# Altium footprint library GyokuRe.PcbLib: 1248 footprints (part 53 of 78)
Each footprint in its own frame and in the unit in brackets; x right, y up, seen from the top. Pads: shape width x height; smd on the part's side, far side on the other; paste and mask are expansions set on the pad; w line width, h text height; cw(c..) or ccw(c..) is an arc to the next point about the centre after c.
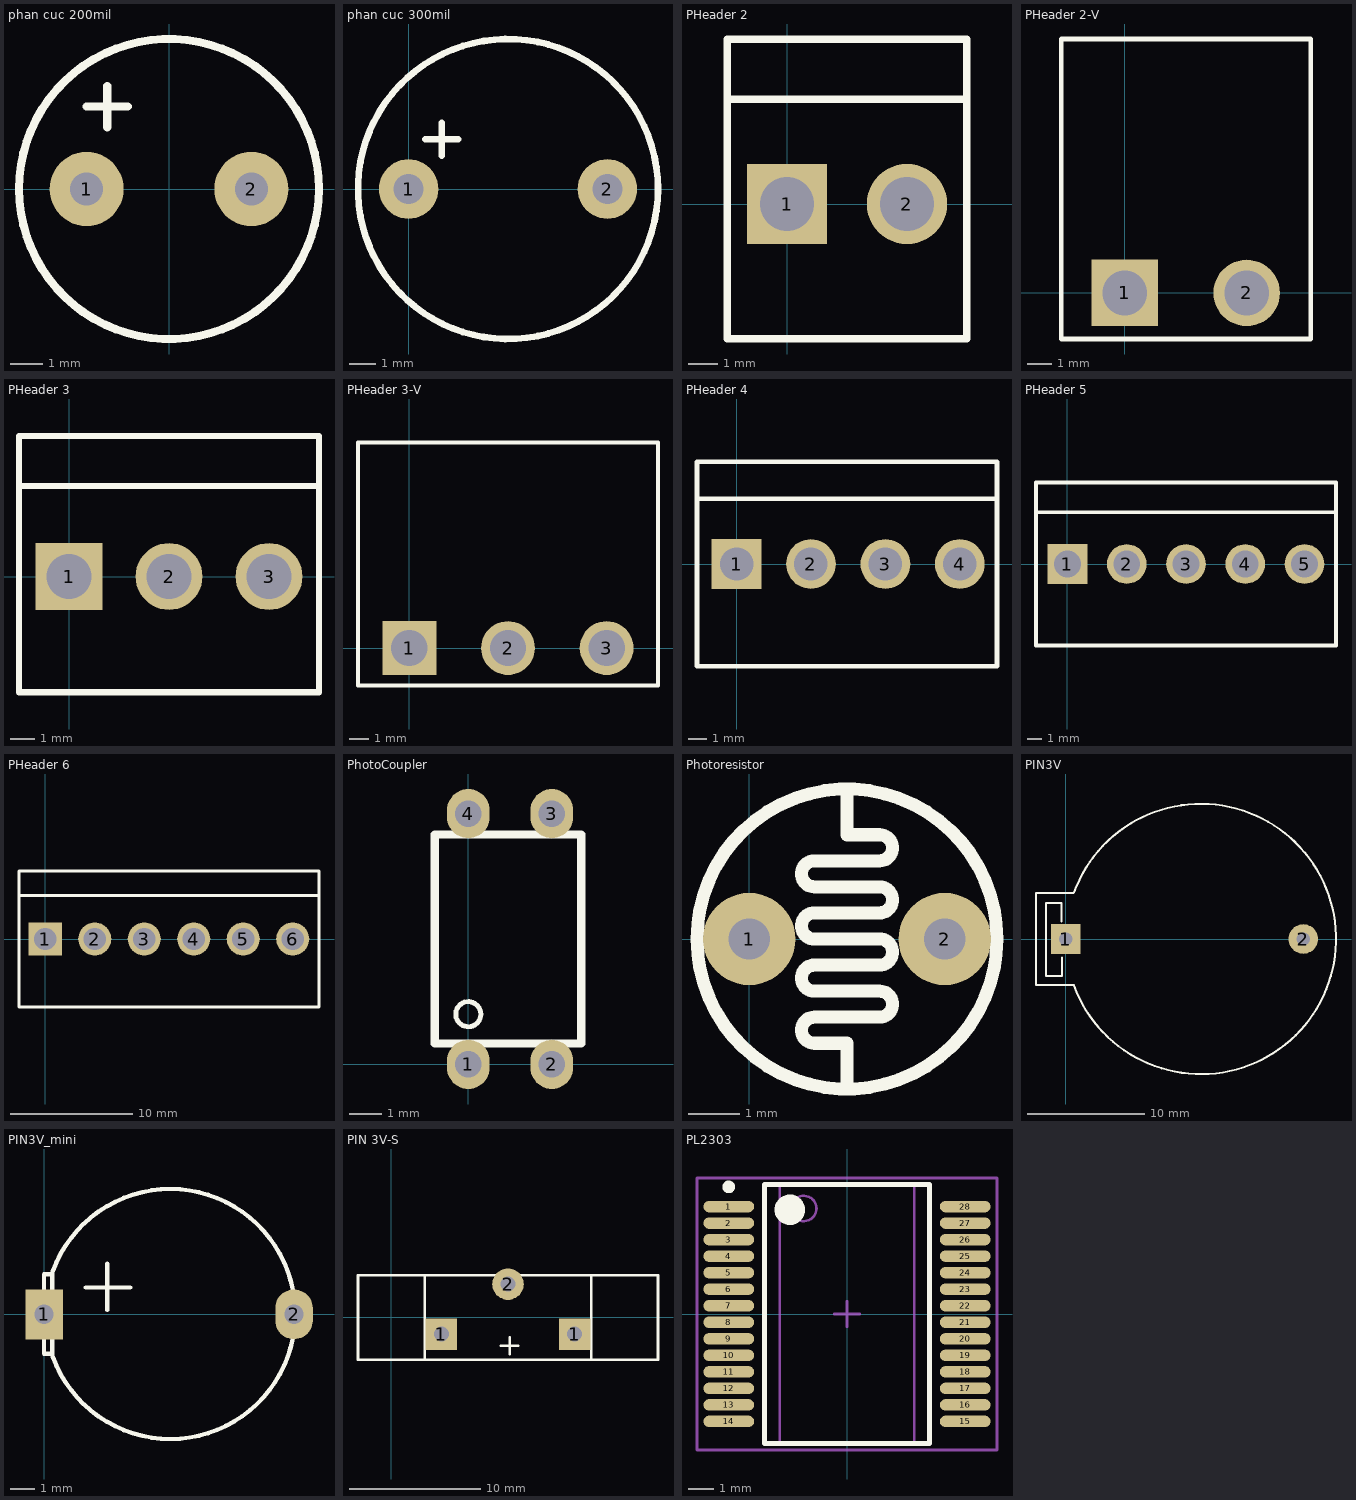
[diagram p52: the footprints below, top view; thin cyan lines are the x and y axes]

## PCBComponent_1 - duplicate [mm]

## phan cuc 200mil [mil]
pads (2):
  round 90 hole 40: 1(-100,0) 2(100,0)
Top Overlay:
  circle w10: c0,0 r182
  lines w10: -100,100 -50,100 ; -75,75 -75,125

## phan cuc 300mil [mil]
pads (2):
  round 90 hole 45: 1(0,0) 2(300,0)
Top Overlay:
  circle w10: c150,0 r226.38
  lines w10: 25,75 75,75 ; 50,50 50,100

## PHeader 2 [mil] "Connector; Header; Power; 2 Position; Solder Pad 35mil"
pads (2):
  rect 107x107 hole 72: 1(0,0)
  round 107 hole 72: 2(160,0)
Top Overlay:
  lines w10: -75,140 240,140 ; -80,-180 -80,220 240,220 240,-180 -80,-180

## PHeader 2-V [mil] "Connector; Header; Power; 2 Position; Vertical; Solder Pad 35mil"
pads (2):
  rect 107x107 hole 72: 1(0,0)
  round 107 hole 72: 2(196,0)
Top Overlay:
  lines w7.87: -102,-74 299,-74 299,408 -102,408 -102,-74
3D body "User Library-BigHeader 5EHDR_1P.step": height 124.02, standoff -366.97, extent 97.58,-68.89 294.43,403.55
3D body "User Library-BigHeader 5EHDR_1P.step": height 124.02, standoff -366.97, extent -98.42,-68.89 98.43,403.55

## PHeader 3 [mil] "Connector; Power; Header; 3 Position; Solder Pad 35mil"
pads (3):
  rect 107x107 hole 72: 1(0,0)
  round 107 hole 72: 2(160,0) 3(320,0)
Top Overlay:
  lines w10: -80,145 400,145 ; -80,-185 -80,225 400,225 400,-185 -80,-185

## PHeader 3-V [mil] "Connector; Header; Power; 3 Position; Vertical; Solder Pad 35mil"
pads (3):
  rect 107x107 hole 72: 1(0,0)
  round 107 hole 72: 2(196,0) 3(392,0)
Top Overlay:
  lines w7.87: -102,-74 494,-74 494,408 -102,408 -102,-74
3D body "User Library-BigHeader 5EHDR_1P.step": height 124.02, standoff -366.97, extent 97.58,-68.89 294.43,403.55
3D body "User Library-BigHeader 5EHDR_1P.step": height 124.02, standoff -366.97, extent -98.42,-68.89 98.43,403.55
3D body "User Library-BigHeader 5EHDR_1P.step": height 124.02, standoff -366.97, extent 293.58,-68.89 490.43,403.55

## PHeader 4 [mil] "Connector; Header; Power; 4 Position; Solder Pad 35mil"
pads (4):
  rect 107x107 hole 72: 1(0,0)
  round 107 hole 72: 2(160,0) 3(320,0) 4(480,0)
Top Overlay:
  lines w10: -85,140 555,140 ; -85,-220 560,-220 560,220 -85,220 -85,-220

## PHeader 5 [mil] "Connector; Header; Power; 5 Position; Solder Pad 35mil"
pads (5):
  rect 107x107 hole 72: 1(0,0)
  round 107 hole 72: 2(160,0) 3(320,0) 4(480,0) 5(640,0)
Top Overlay:
  lines w10: -85,140 725,140 ; -85,-220 725,-220 725,220 -85,220 -85,-220

## PHeader 6 [mil] "Connector; Header; Power; 6 Position; Solder Pad 35mil"
pads (6):
  rect 107x107 hole 72: 1(0,0)
  round 107 hole 72: 2(160,0) 3(320,0) 4(480,0) 5(640,0) 6(800,0)
Top Overlay:
  lines w10: -85,140 885,140 ; -85,-220 885,-220 885,220 -85,220 -85,-220

## PhotoCoupler [mm] "Opto quang"
pads (4):
  oval 1.3x1.5 hole 0.8: 1(0,0) 2(2.54,0) 3(2.54,7.62) 4(0,7.62)
Top Overlay:
  circle w0.15: c0,1.524 r0.381
  lines w0.254: -1.016,0.635 3.429,0.635 3.429,6.985 -1.016,6.985 -1.016,0.635
3D body "SW3DPS-DIP4-DEFAULT.step": height 4.31, standoff -3.28, extent -1.532,-0.19 4.008,7.81

## Photoresistor [mm]
pads (2):
  round 1.8 hole 0.8: 1(0,0) 2(3.81,0)
Top Overlay:
  circle w0.254: c1.905,0 r2.924
  lines w0.254: 1.905,-2.921 1.905,-2.032 1.27,-2.032 cw(c1.27,-1.778) 1.27,-1.524 2.54,-1.524 ccw(c2.54,-1.27) 2.54,-1.016 1.27,-1.016 cw(c1.27,-0.762) 1.27,-0.508 2.54,-0.508 ccw(c2.54,-0.254) 2.54,0 1.27,0 cw(c1.27,0.254) 1.27,0.508 2.54,0.508 ccw(c2.54,0.762) 2.54,1.016 1.27,1.016 cw(c1.27,1.27) 1.27,1.524 2.54,1.524 ccw(c2.54,1.778) 2.54,2.032 1.905,2.032 1.905,2.921

## PIN3V [mil] "Socket PIN 3V"
pads (2):
  rect 100x100 hole 45: 1(0,0)
  round 100 hole 45: 2(800,0)
Top Overlay:
  lines w7: -14,59 -14,121 -66,121 -66,-124 -13,-124 -13,-63 ; 26.33,155 -100,155 -100,-155 27.93,-155 ; 27.6,156.07 cw(c455,0) 27.93,-156.97
3D body "batter2.STEP": height 278.16, standoff -137.2, extent -128.09,-446.83 1001.83,448.83

## PIN3V_mini [mil] "Socket PIN 3V"
pads (2):
  rect 60x80 hole 31: 1(0,0)
  oval 60x80 hole 31: 2(400,0)
Top Overlay:
  lines w7: 11,64 0,64 0,-63 13,-63 ; 13,-64 13,65 ; 14,-67.81 ccw(c201.94,0.6) 14,69 ; 67,43 138,43 ; 101,7 101,81

## PIN 3V-S [mil] "Socket PIN 3V"
pads (3):
  rect 95x95 hole 45: 1(150,-50) 1(550,-50)
  round 95 hole 45: 2(350,100)
Top Overlay:
  lines w8: 100,-127 100,127 ; 329,-85 380,-85 ; 355,-110 355,-60 ; 600,-127 600,127 ; -100,-127 800,-127 800,127 -100,127 -100,-127

## PL2303 [mm] "SOP, 28-Leads, Body 10,2x5,3mm (max), Pitch 0,65mm, IPC Medium Density"
height 2
pads (28):
  oval 2x0.45 smd: 1(-4.65,4.225) 2(-4.65,3.575) 3(-4.65,2.925) 4(-4.65,2.275) 5(-4.65,1.625) 6(-4.65,0.975) 7(-4.65,0.325) 8(-4.65,-0.325) 9(-4.65,-0.975) 10(-4.65,-1.625) 11(-4.65,-2.275) 12(-4.65,-2.925) 13(-4.65,-3.575) 14(-4.65,-4.225) 15(4.65,-4.225) 16(4.65,-3.575) 17(4.65,-2.925) 18(4.65,-2.275) 19(4.65,-1.625) 20(4.65,-0.975) 21(4.65,-0.325) 22(4.65,0.325) 23(4.65,0.975) 24(4.65,1.625) 25(4.65,2.275) 26(4.65,2.925) 27(4.65,3.575) 28(4.65,4.225)
Top Overlay:
  circle w0.25: c-4.65,5 r0.125
  circle w0.6: c-2.25,4.1 r0.3
  lines w0.2: -3.25,-5.1 -3.25,5.1 3.25,5.1 3.25,-5.1 -3.25,-5.1
Mechanical 13:
  circle w0.1: c-1.7,4.15 r0.5
  lines w0.1: -2.65,-5.1 -2.65,5.1 2.65,5.1 2.65,-5.1 -2.65,-5.1
Mechanical 15:
  lines w0.1: -0.5,0 0.5,0 ; 0,-0.5 0,0.5 ; -5.9,-5.35 -5.9,5.35 5.9,5.35 5.9,-5.35 -5.9,-5.35
3D body: height 2, standoff 0.25, extent -2.65,-5.1 2.65,5.1